# Altium footprint library 2022_AESK_UAV.PcbLib: 25 footprints (part 2 of 2)
Each footprint in its own frame and in the unit in brackets; x right, y up, seen from the top. Pads: shape width x height; smd on the part's side, far side on the other; paste and mask are expansions set on the pad; w line width, h text height; cw(c..) or ccw(c..) is an arc to the next point about the centre after c.
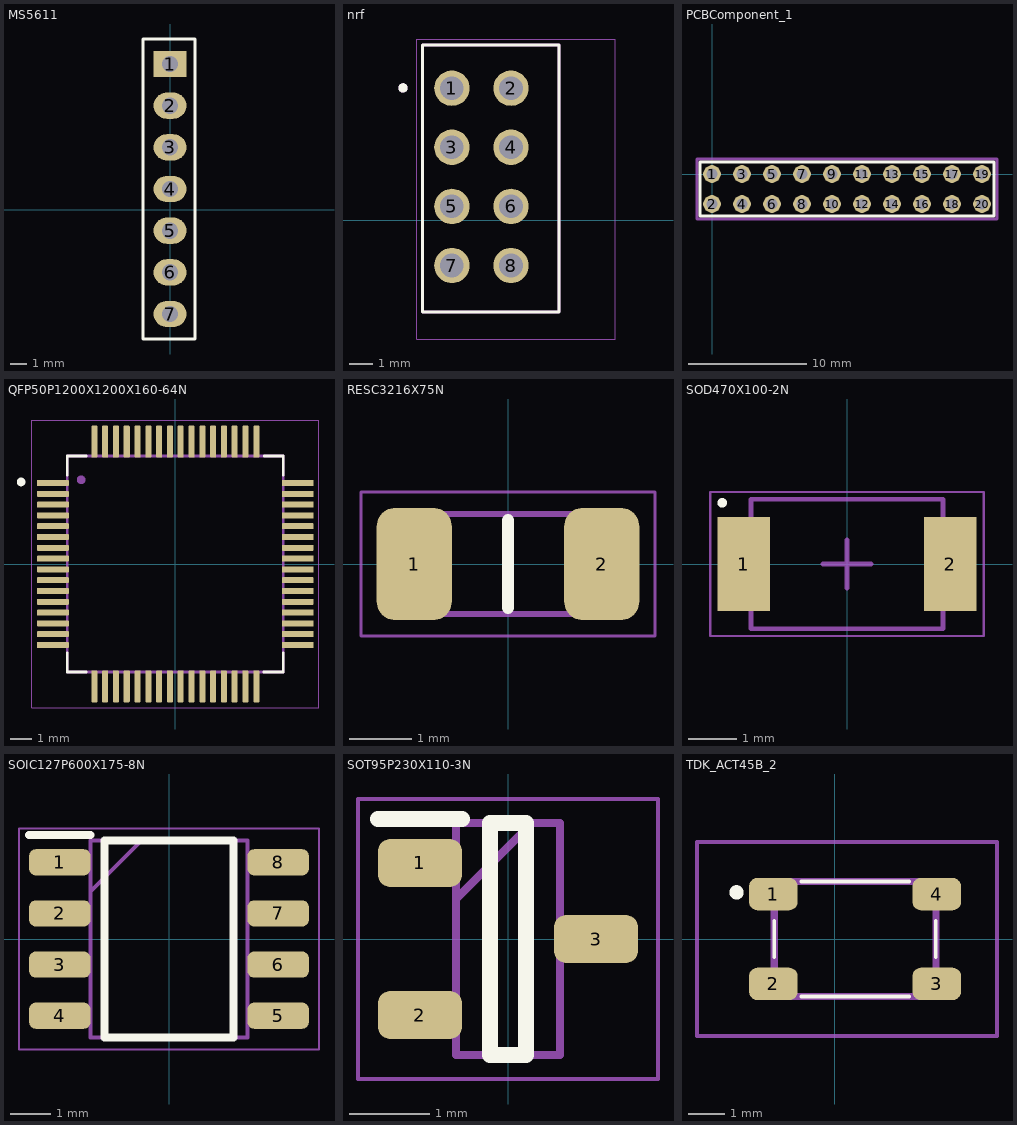
[diagram p1: the footprints below, top view; thin cyan lines are the x and y axes]

## MS5611 [mm]
pads (7):
  rect 2x1.6 hole 1: 1(0,8.89)
  oval 2x1.6 hole 1: 2(0,6.35) 3(0,3.81) 4(0,1.27) 5(0,-1.27) 6(0,-3.81) 7(0,-6.35)
Top Overlay:
  lines w0.2: -1.651,-7.874 -1.651,10.414 1.524,10.414 1.524,-7.874 -1.651,-7.874
3D body "User Library-MPU 6050 IMU.STEP": height 6.32, standoff -4.85, extent -14.605,-10.681 1.27,10.427

## nrf [mil]
pads (8):
  round 60 hole 40: 1(-601.75,223.19) 2(-501.75,223.19) 3(-601.75,123.19) 4(-501.75,123.19) 5(-601.75,23.18) 6(-501.75,23.18) 7(-601.75,-76.81) 8(-501.75,-76.81)
Top Overlay:
  circle w7.87: c-684.45,223.62 r3.94
  lines w5: -651.73,296.5 -420.55,296.5 -420.55,-155.43 -651.69,-155.43 -651.69,296.46 -651.73,296.5
Mechanical 13:
  circle w7.87: c-684.45,223.62 r3.94
  lines w5: -651.75,-155.51 -651.75,296.5 -420.52,296.5 -420.28,296.26 -420.28,-155.51 -651.75,-155.51
Mechanical 15:
  lines w1.97: -325.32,-201.14 -661.59,-201.14 -661.59,306.34 -325.32,306.34 -325.32,-200.79
3D body "NRF24L01L.SLDPRT": height 688.98, standoff -59.06, extent -674.8,-231.1 1218.9,379.13

## PCBComponent_1 [mm]
pads (21):
  round 1.5 hole 0.9 paste+0: 1(0,0) 1(0,0) 2(0,-2.54) 3(2.54,0) 4(2.54,-2.54) 5(5.08,0) 6(5.08,-2.54) 7(7.62,0) 8(7.62,-2.54) 9(10.16,0) 10(10.16,-2.54) 11(12.7,0) 12(12.7,-2.54) 13(15.24,0) 14(15.24,-2.54) 15(17.78,0) 16(17.78,-2.54) 17(20.32,0) 18(20.32,-2.54) 19(22.86,0) 20(22.86,-2.54)
Top Overlay:
  lines w0.254: -1.016,-3.556 -1.016,1.016 23.876,1.016 23.876,-3.556 -1.016,-3.556
Mechanical 15:
  lines w0.254: -1.27,-3.81 -1.27,1.27 24.13,1.27 24.13,-3.81 -1.27,-3.81
3D body "pin header double row- 20 contacts.SLDPRT": height 8.54, standoff -3, extent -1.27,-3.81 24.13,1.27

## QFP50P1200X1200X160-64N [mm]
pads (64):
  rrect25% 1.47x0.28 smd: 1(-5.67,3.75) 2(-5.67,3.25) 3(-5.67,2.75) 4(-5.67,2.25) 5(-5.67,1.75) 6(-5.67,1.25) 7(-5.67,0.75) 8(-5.67,0.25) 9(-5.67,-0.25) 10(-5.67,-0.75) 11(-5.67,-1.25) 12(-5.67,-1.75) 13(-5.67,-2.25) 14(-5.67,-2.75) 15(-5.67,-3.25) 16(-5.67,-3.75) 33(5.67,-3.75) 34(5.67,-3.25) 35(5.67,-2.75) 36(5.67,-2.25) 37(5.67,-1.75) 38(5.67,-1.25) 39(5.67,-0.75) 40(5.67,-0.25) 41(5.67,0.25) 42(5.67,0.75) 43(5.67,1.25) 44(5.67,1.75) 45(5.67,2.25) 46(5.67,2.75) 47(5.67,3.25) 48(5.67,3.75)
  rrect25% 0.28x1.47 smd: 17(-3.75,-5.67) 18(-3.25,-5.67) 19(-2.75,-5.67) 20(-2.25,-5.67) 21(-1.75,-5.67) 22(-1.25,-5.67) 23(-0.75,-5.67) 24(-0.25,-5.67) 25(0.25,-5.67) 26(0.75,-5.67) 27(1.25,-5.67) 28(1.75,-5.67) 29(2.25,-5.67) 30(2.75,-5.67) 31(3.25,-5.67) 32(3.75,-5.67) 49(3.75,5.67) 50(3.25,5.67) 51(2.75,5.67) 52(2.25,5.67) 53(1.75,5.67) 54(1.25,5.67) 55(0.75,5.67) 56(0.25,5.67) 57(-0.25,5.67) 58(-0.75,5.67) 59(-1.25,5.67) 60(-1.75,5.67) 61(-2.25,5.67) 62(-2.75,5.67) 63(-3.25,5.67) 64(-3.75,5.67)
Top Overlay:
  circle w0.2: c-7.14,3.8 r0.1
  lines w0.127: -5,-4.125 -5,-5 -4.125,-5 ; -5,4.125 -5,5 -4.125,5 ; 4.092,-5 5,-5 5,-4.125 ; 4.125,5 5,5 5,4.125
Mechanical 13:
  circle w0.2: c-4.36,3.9 r0.1
  lines w0.127: -5,-5 5,-5 5,5 -5,5 -5,-5
Mechanical 15:
  lines w0.05: -6.655,-6.655 6.655,-6.655 6.655,6.655 -6.655,6.655 -6.655,-6.655
3D body "STM32F405RGT6.STEP": height 1.58, standoff -0.02, extent -6,-6 6,6

## RESC3216X75N [mm]
pads (2):
  rrect50% 1.2x1.8 smd: 1(-1.5,0) 2(1.5,0)
Top Overlay:
  lines w0.2: 0,-0.7 0,0.7
Mechanical 13:
  lines w0.1: -1.6,-0.8 1.6,-0.8 1.6,0.8 -1.6,0.8 -1.6,-0.8
Mechanical 15:
  lines w0.05: -2.35,-1.15 2.35,-1.15 2.35,1.15 -2.35,1.15 -2.35,-1.15
3D body "CR1206-FX-6192ELF.stp": height 0.75, standoff 0, extent -1.6,-0.8 1.6,0.8

## SOD470X100-2N [mm]
pads (2):
  rect 1.1x1.95 smd: 1(-2.15,0) 2(2.15,0)
Top Overlay:
  circle w0.1: c-2.6,1.275 r0.05
Mechanical 13:
  lines w0.1: -2,-1.35 2,-1.35 2,1.35 -2,1.35 -2,-1.35
Mechanical 15:
  lines w0.05: -2.85,-1.5 2.85,-1.5 2.85,1.5 -2.85,1.5 -2.85,-1.5
  lines w0.1: -0.5,0 0.5,0 ; 0,-0.5 0,0.5
3D body "SOD470X100-2N.step": height 1, standoff 0, extent -2.35,-1.35 2.35,1.35

## SOIC127P600X175-8N [mm]
pads (8):
  rrect50% 1.525x0.65 smd: 1(-2.712,1.905) 2(-2.712,0.635) 3(-2.712,-0.635) 4(-2.712,-1.905) 5(2.712,-1.905) 6(2.712,-0.635) 7(2.712,0.635) 8(2.712,1.905)
Top Overlay:
  lines w0.2: -3.475,2.58 -1.95,2.58 ; -1.6,-2.45 1.6,-2.45 1.6,2.45 -1.6,2.45 -1.6,-2.45
Mechanical 13:
  lines w0.1: -1.95,1.18 -0.68,2.45 ; -1.95,-2.45 1.95,-2.45 1.95,2.45 -1.95,2.45 -1.95,-2.45
Mechanical 15:
  lines w0.05: -3.725,-2.75 3.725,-2.75 3.725,2.75 -3.725,2.75 -3.725,-2.75
3D body "NE555DR.stp": height 1.75, standoff 0, extent -3,-2.45 3,2.45

## SOT95P230X110-3N [mm]
pads (3):
  rrect50% 1.05x0.6 smd: 1(-1.1,0.95) 2(-1.1,-0.95) 3(1.1,0)
Top Overlay:
  lines w0.2: -1.625,1.5 -0.575,1.5 ; -0.225,-1.45 -0.225,1.45 0.225,1.45 0.225,-1.45 -0.225,-1.45
Mechanical 13:
  lines w0.1: -0.65,0.5 0.3,1.45 ; -0.65,-1.45 -0.65,1.45 0.65,1.45 0.65,-1.45 -0.65,-1.45
Mechanical 15:
  lines w0.05: -1.875,-1.75 -1.875,1.75 1.875,1.75 1.875,-1.75 -1.875,-1.75
3D body "PESD2CAN,215.stp": height 1.1, standoff 0, extent -1.15,-1.45 1.15,1.45

## TDK_ACT45B_2 [mm]
pads (4):
  rrect50% 1.35x0.9 smd: 1(-1.712,1.25) 2(-1.712,-1.25) 3(2.838,-1.25) 4(2.838,1.25)
Top Overlay:
  lines w0.1: -1.687,-0.5 -1.687,0.5 ; -0.937,-1.6 2.063,-1.6 ; -0.937,1.6 2.063,1.6 ; 2.813,-0.5 2.813,0.5
  lines w0.2: -2.738,1.2 ccw(c-2.738,1.3) -2.738,1.4 ccw(c-2.738,1.3) -2.738,1.2
Mechanical 13:
  lines w0.2: -1.687,-1.6 -1.687,1.6 2.813,1.6 2.813,-1.6 -1.687,-1.6
Mechanical 15:
  lines w0.1: -3.838,-2.7 -3.838,2.7 4.513,2.7 4.513,-2.7 -3.838,-2.7
3D body "B82787C0104H002.stp": height 3.1, standoff 0, extent -2.297,-1.61 3.423,1.61